# Altium schematic symbol library Analog Devices Operational Amplifiers.SchLib: 2102 symbols (part 23 of 35) (continued)
## ADA4004-1ARJZ-RL
designator U?
Single Channel Wide Bandwidth Operational Amplifier, 12 MHz BW, 2.7 V/us SR, Industrial, 5-pin SOT23 (RJ-5), Reel; Generic Part Number: ADA4004-1; Manufacturer: Analog Devices; PartNumber: ADA4004-1ARJZ-RL; Amplifiers Per Package: 1; Input Bias Current: 40nA; Input Offset Voltage: 40uV; Iq/Amp: 2.2mA; Small Signal Bandwidth: 12MHz; V Span Max: 30V; V Span Min: 10V; DatasheetVersion: Rev. G; PackageVersion: 121608-A; PackageReference: RJ-5; PackageDescription: 5-Pin Small Outline Transistor Package, Body 2.9 x 1.6 mm, Pitch 0.95 mm; Supplier 1: Digi-Key; Supplier Part Number 1: ADA4004-1ARJZ-RL-ND; Slew Rate: 2.7V/us; Mounting Technology: Surface Mount; Code_JEDEC: MO-178-AA; ComponentLink1Description: Manufacturer URL; ComponentLink1URL: http://www.analog.com/en/index.html; ComponentLink2Description: Datasheet; ComponentLink2URL: http://www.analog.com/static/imported-files/data_sheets/ADA4004-1_4004-2_4004-4.pdf; ComponentLink3Description: Package Specification; ComponentLink3URL: http://www.analog.com/static/imported-files/packages/PKG_PDF/SOT-23(RJ)/RJ_5.pdf
footprint ADI-RJ-5_N (SOT-23, 5-Leads, Body 2.9x1.6mm, Pitch 0.95mm, IPC Medium Density)
footprint ADI-RJ-5_L (SOT-23, 5-Leads, Body 2.9x1.6mm, Pitch 0.95mm, IPC High Density)
footprint ADI-RJ-5_M (SOT-23, 5-Leads, Body 2.9x1.6mm, Pitch 0.95mm, IPC Low Density)
pins: 1 OUT (out), 2 -V (power), 3 +IN (in), 4 -IN (in), 5 +V (power)

## ADA4004-1ARZ
designator U?
Single Channel Wide Bandwidth Operational Amplifier, 12 MHz BW, 2.7 V/us SR, Industrial, 8-pin SOIC (R-8), Tube; Generic Part Number: ADA4004-1; Manufacturer: Analog Devices; PartNumber: ADA4004-1ARZ; Amplifiers Per Package: 1; Input Bias Current: 40nA; Input Offset Voltage: 40uV; Iq/Amp: 2.2mA; Small Signal Bandwidth: 12MHz; V Span Max: 30V; V Span Min: 10V; DatasheetVersion: Rev. G; PackageVersion: 060506-A; PackageReference: R-8; PackageDescription: 8-Pin Standard Small Outline Package, Body 3.9 x 4.9 mm, Pitch 1.27 mm; Supplier 1: Digi-Key; Supplier Part Number 1: ADA4004-1ARZ-ND; Supplier 2: Farnell; Supplier Part Number 2: 2077698; Supplier 3: Newark; Supplier Part Number 3: 34P2947; Slew Rate: 2.7V/us; Mounting Technology: Surface Mount; Code_JEDEC: MS-012-AA; ComponentLink1Description: Manufacturer URL; ComponentLink1URL: http://www.analog.com/en/index.html; ComponentLink2Description: Datasheet; ComponentLink2URL: http://www.analog.com/static/imported-files/data_sheets/ADA4004-1_4004-2_4004-4.pdf; ComponentLink3Description: Package Specification; ComponentLink3URL: http://www.analog.com/static/imported-files/packages/PKG_PDF/SOIC_Narrow%20(R)/R_8.pdf
footprint ADI-R-8_N (SOIC, 8-Leads, Body 4.9x3.9mm, Pitch 1.27mm, IPC Medium Density)
footprint ADI-R-8_L (SOIC, 8-Leads, Body 4.9x3.9mm, Pitch 1.27mm, IPC High Density)
footprint ADI-R-8_M (SOIC, 8-Leads, Body 4.9x3.9mm, Pitch 1.27mm, IPC Low Density)
part A pins: 2 -IN (in), 3 +IN (in), 4 -V (power), 6 OUT (out), 7 +V (power)
part B pins: 1 NC, 5 NC, 8 NC

## ADA4004-1ARZ-R7
designator U?
Single Channel Wide Bandwidth Operational Amplifier, 12 MHz BW, 2.7 V/us SR, Industrial, 8-pin SOIC (R-8), Reel; Generic Part Number: ADA4004-1; Manufacturer: Analog Devices; PartNumber: ADA4004-1ARZ-R7; Amplifiers Per Package: 1; Input Bias Current: 40nA; Input Offset Voltage: 40uV; Iq/Amp: 2.2mA; Small Signal Bandwidth: 12MHz; V Span Max: 30V; V Span Min: 10V; DatasheetVersion: Rev. G; PackageVersion: 060506-A; PackageReference: R-8; PackageDescription: 8-Pin Standard Small Outline Package, Body 3.9 x 4.9 mm, Pitch 1.27 mm; Supplier 1: Digi-Key; Supplier Part Number 1: ADA4004-1ARZ-R7-ND; Slew Rate: 2.7V/us; Mounting Technology: Surface Mount; Code_JEDEC: MS-012-AA; ComponentLink1Description: Manufacturer URL; ComponentLink1URL: http://www.analog.com/en/index.html; ComponentLink2Description: Datasheet; ComponentLink2URL: http://www.analog.com/static/imported-files/data_sheets/ADA4004-1_4004-2_4004-4.pdf; ComponentLink3Description: Package Specification; ComponentLink3URL: http://www.analog.com/static/imported-files/packages/PKG_PDF/SOIC_Narrow%20(R)/R_8.pdf
footprint ADI-R-8_N (SOIC, 8-Leads, Body 4.9x3.9mm, Pitch 1.27mm, IPC Medium Density)
footprint ADI-R-8_L (SOIC, 8-Leads, Body 4.9x3.9mm, Pitch 1.27mm, IPC High Density)
footprint ADI-R-8_M (SOIC, 8-Leads, Body 4.9x3.9mm, Pitch 1.27mm, IPC Low Density)
part A pins: 2 -IN (in), 3 +IN (in), 4 -V (power), 6 OUT (out), 7 +V (power)
part B pins: 1 NC, 5 NC, 8 NC

## ADA4004-1ARZ-RL
designator U?
Single Channel Wide Bandwidth Operational Amplifier, 12 MHz BW, 2.7 V/us SR, Industrial, 8-pin SOIC (R-8), Reel; Generic Part Number: ADA4004-1; Manufacturer: Analog Devices; PartNumber: ADA4004-1ARZ-RL; Amplifiers Per Package: 1; Input Bias Current: 40nA; Input Offset Voltage: 40uV; Iq/Amp: 2.2mA; Small Signal Bandwidth: 12MHz; V Span Max: 30V; V Span Min: 10V; DatasheetVersion: Rev. G; PackageVersion: 060506-A; PackageReference: R-8; PackageDescription: 8-Pin Standard Small Outline Package, Body 3.9 x 4.9 mm, Pitch 1.27 mm; Supplier 1: Digi-Key; Supplier Part Number 1: ADA4004-1ARZ-RL-ND; Slew Rate: 2.7V/us; Mounting Technology: Surface Mount; Code_JEDEC: MS-012-AA; ComponentLink1Description: Manufacturer URL; ComponentLink1URL: http://www.analog.com/en/index.html; ComponentLink2Description: Datasheet; ComponentLink2URL: http://www.analog.com/static/imported-files/data_sheets/ADA4004-1_4004-2_4004-4.pdf; ComponentLink3Description: Package Specification; ComponentLink3URL: http://www.analog.com/static/imported-files/packages/PKG_PDF/SOIC_Narrow%20(R)/R_8.pdf
footprint ADI-R-8_N (SOIC, 8-Leads, Body 4.9x3.9mm, Pitch 1.27mm, IPC Medium Density)
footprint ADI-R-8_L (SOIC, 8-Leads, Body 4.9x3.9mm, Pitch 1.27mm, IPC High Density)
footprint ADI-R-8_M (SOIC, 8-Leads, Body 4.9x3.9mm, Pitch 1.27mm, IPC Low Density)
part A pins: 2 -IN (in), 3 +IN (in), 4 -V (power), 6 OUT (out), 7 +V (power)
part B pins: 1 NC, 5 NC, 8 NC

## ADA4004-2ARMZ
designator U?
Double Channel Wide Bandwidth Operational Amplifier, 12 MHz BW, 2.7 V/us SR, Industrial, 8-pin SOP (RM-8), Tube; Generic Part Number: ADA4004-2; Manufacturer: Analog Devices; PartNumber: ADA4004-2ARMZ; Amplifiers Per Package: 2; Input Bias Current: 40nA; Input Offset Voltage: 40uV; Iq/Amp: 2.2mA; Small Signal Bandwidth: 12MHz; V Span Max: 30V; V Span Min: 10V; DatasheetVersion: Rev. G; PackageReference: RM-8; PackageDescription: 8-Pin Mini Small Outline Package, Body 3 x 3 mm, Pitch 0.65 mm; Supplier 1: Digi-Key; Supplier Part Number 1: ADA4004-2ARMZ-ND; Supplier 2: Farnell; Supplier Part Number 2: 2077696; Supplier 3: Newark; Supplier Part Number 3: 34P2950; Slew Rate: 2.7V/us; Mounting Technology: Surface Mount; Code_JEDEC: MO-187-AA; ComponentLink1Description: Manufacturer URL; ComponentLink1URL: http://www.analog.com/en/index.html; ComponentLink2Description: Datasheet; ComponentLink2URL: http://www.analog.com/static/imported-files/data_sheets/ADA4004-1_4004-2_4004-4.pdf; ComponentLink3Description: Package Specification; ComponentLink3URL: http://www.analog.com/static/imported-files/packages/PKG_PDF/MSOP%28RM%29/RM_8.pdf; ComponentLink4Description: Reference Circuit; ComponentLink4URL: http://www.analog.com/en/all-operational-amplifiers-op-amps/operational-amplifiers-op-amps/ada4004-2/products/product.html#product-recommendations
footprint ADI-RM-8_N (SOP, 8-Leads, Body 3x3mm, Pitch 0.65mm, IPC Medium Density)
footprint ADI-RM-8_L (SOP, 8-Leads, Body 3x3mm, Pitch 0.65mm, IPC High Density)
footprint ADI-RM-8_M (SOP, 8-Leads, Body 3x3mm, Pitch 0.65mm, IPC Low Density)
pins on every part: 4 -V (power), 8 +V (power)
part A pins: 1 OUT A (out), 2 -IN A (in), 3 +IN A (in)
part B pins: 5 +IN B (in), 6 -IN B (in), 7 OUT B (out)

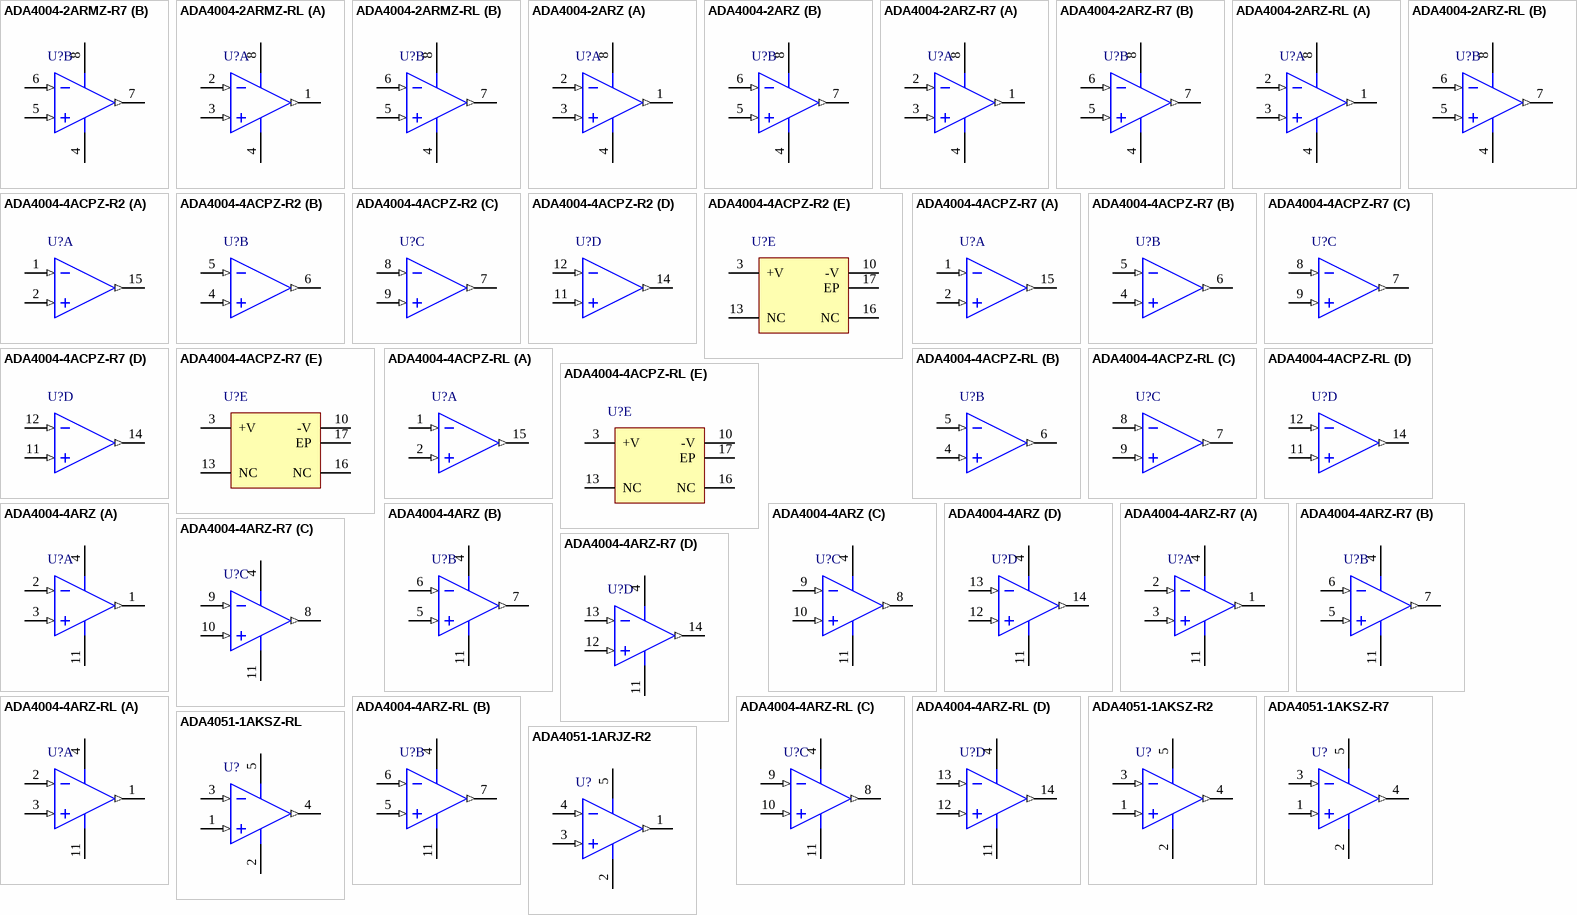
[diagram p73: symbols ADA4004-2ARMZ-R7 to ADA4051-1ARJZ-R2]

## ADA4004-2ARMZ-R7
designator U?
Double Channel Wide Bandwidth Operational Amplifier, 12 MHz BW, 2.7 V/us SR, Industrial, 8-pin SOP (RM-8), Reel; Generic Part Number: ADA4004-2; Manufacturer: Analog Devices; PartNumber: ADA4004-2ARMZ-R7; Amplifiers Per Package: 2; Input Bias Current: 40nA; Input Offset Voltage: 40uV; Iq/Amp: 2.2mA; Small Signal Bandwidth: 12MHz; V Span Max: 30V; V Span Min: 10V; DatasheetVersion: Rev. G; PackageReference: RM-8; PackageDescription: 8-Pin Mini Small Outline Package, Body 3 x 3 mm, Pitch 0.65 mm; Supplier 1: Digi-Key; Supplier Part Number 1: ADA4004-2ARMZ-R7TR-ND; Supplier 2: Digi-Key; Supplier Part Number 2: ADA4004-2ARMZ-R7CT-ND; Supplier 3: Digi-Key; Supplier Part Number 3: ADA4004-2ARMZ-R7DKR-ND; Supplier 4: Newark; Supplier Part Number 4: 34P2952; Slew Rate: 2.7V/us; Mounting Technology: Surface Mount; Code_JEDEC: MO-187-AA; ComponentLink1Description: Manufacturer URL; ComponentLink1URL: http://www.analog.com/en/index.html; ComponentLink2Description: Datasheet; ComponentLink2URL: http://www.analog.com/static/imported-files/data_sheets/ADA4004-1_4004-2_4004-4.pdf; ComponentLink3Description: Package Specification; ComponentLink3URL: http://www.analog.com/static/imported-files/packages/PKG_PDF/MSOP%28RM%29/RM_8.pdf; ComponentLink4Description: Reference Circuit; ComponentLink4URL: http://www.analog.com/en/all-operational-amplifiers-op-amps/operational-amplifiers-op-amps/ada4004-2/products/product.html#product-recommendations
footprint ADI-RM-8_N (SOP, 8-Leads, Body 3x3mm, Pitch 0.65mm, IPC Medium Density)
footprint ADI-RM-8_L (SOP, 8-Leads, Body 3x3mm, Pitch 0.65mm, IPC High Density)
footprint ADI-RM-8_M (SOP, 8-Leads, Body 3x3mm, Pitch 0.65mm, IPC Low Density)
pins on every part: 4 -V (power), 8 +V (power)
part A pins: 1 OUT A (out), 2 -IN A (in), 3 +IN A (in)
part B pins: 5 +IN B (in), 6 -IN B (in), 7 OUT B (out)

## ADA4004-2ARMZ-RL
designator U?
Double Channel Wide Bandwidth Operational Amplifier, 12 MHz BW, 2.7 V/us SR, Industrial, 8-pin SOP (RM-8), Reel; Generic Part Number: ADA4004-2; Manufacturer: Analog Devices; PartNumber: ADA4004-2ARMZ-RL; Amplifiers Per Package: 2; Input Bias Current: 40nA; Input Offset Voltage: 40uV; Iq/Amp: 2.2mA; Small Signal Bandwidth: 12MHz; V Span Max: 30V; V Span Min: 10V; DatasheetVersion: Rev. G; PackageReference: RM-8; PackageDescription: 8-Pin Mini Small Outline Package, Body 3 x 3 mm, Pitch 0.65 mm; Supplier 1: Digi-Key; Supplier Part Number 1: ADA4004-2ARMZ-RL-ND; Supplier 2: Newark; Supplier Part Number 2: 34P2951; Slew Rate: 2.7V/us; Mounting Technology: Surface Mount; Code_JEDEC: MO-187-AA; ComponentLink1Description: Manufacturer URL; ComponentLink1URL: http://www.analog.com/en/index.html; ComponentLink2Description: Datasheet; ComponentLink2URL: http://www.analog.com/static/imported-files/data_sheets/ADA4004-1_4004-2_4004-4.pdf; ComponentLink3Description: Package Specification; ComponentLink3URL: http://www.analog.com/static/imported-files/packages/PKG_PDF/MSOP%28RM%29/RM_8.pdf; ComponentLink4Description: Reference Circuit; ComponentLink4URL: http://www.analog.com/en/all-operational-amplifiers-op-amps/operational-amplifiers-op-amps/ada4004-2/products/product.html#product-recommendations
footprint ADI-RM-8_N (SOP, 8-Leads, Body 3x3mm, Pitch 0.65mm, IPC Medium Density)
footprint ADI-RM-8_L (SOP, 8-Leads, Body 3x3mm, Pitch 0.65mm, IPC High Density)
footprint ADI-RM-8_M (SOP, 8-Leads, Body 3x3mm, Pitch 0.65mm, IPC Low Density)
pins on every part: 4 -V (power), 8 +V (power)
part A pins: 1 OUT A (out), 2 -IN A (in), 3 +IN A (in)
part B pins: 5 +IN B (in), 6 -IN B (in), 7 OUT B (out)

## ADA4004-2ARZ
designator U?
Double Channel Wide Bandwidth Operational Amplifier, 12 MHz BW, 2.7 V/us SR, Industrial, 8-pin SOIC (R-8), Tube; Generic Part Number: ADA4004-2; Manufacturer: Analog Devices; PartNumber: ADA4004-2ARZ; Amplifiers Per Package: 2; Input Bias Current: 40nA; Input Offset Voltage: 40uV; Iq/Amp: 2.2mA; Small Signal Bandwidth: 12MHz; V Span Max: 30V; V Span Min: 10V; DatasheetVersion: Rev. G; PackageVersion: 060506-A; PackageReference: R-8; PackageDescription: 8-Pin Standard Small Outline Package, Body 3.9 x 4.9 mm, Pitch 1.27 mm; Supplier 1: Digi-Key; Supplier Part Number 1: ADA4004-2ARZ-ND; Supplier 2: Farnell; Supplier Part Number 2: 2077697; Supplier 3: Newark; Supplier Part Number 3: 34P2953; Slew Rate: 2.7V/us; Mounting Technology: Surface Mount; Code_JEDEC: MS-012-AA; ComponentLink1Description: Manufacturer URL; ComponentLink1URL: http://www.analog.com/en/index.html; ComponentLink2Description: Datasheet; ComponentLink2URL: http://www.analog.com/static/imported-files/data_sheets/ADA4004-1_4004-2_4004-4.pdf; ComponentLink3Description: Package Specification; ComponentLink3URL: http://www.analog.com/static/imported-files/packages/PKG_PDF/SOIC_Narrow%20(R)/R_8.pdf; ComponentLink4Description: Reference Circuit; ComponentLink4URL: http://www.analog.com/en/all-operational-amplifiers-op-amps/operational-amplifiers-op-amps/ada4004-2/products/product.html#product-recommendations
footprint ADI-R-8_N (SOIC, 8-Leads, Body 4.9x3.9mm, Pitch 1.27mm, IPC Medium Density)
footprint ADI-R-8_L (SOIC, 8-Leads, Body 4.9x3.9mm, Pitch 1.27mm, IPC High Density)
footprint ADI-R-8_M (SOIC, 8-Leads, Body 4.9x3.9mm, Pitch 1.27mm, IPC Low Density)
pins on every part: 4 -V (power), 8 +V (power)
part A pins: 1 OUT A (out), 2 -IN A (in), 3 +IN A (in)
part B pins: 5 +IN B (in), 6 -IN B (in), 7 OUT B (out)

## ADA4004-2ARZ-R7
designator U?
Double Channel Wide Bandwidth Operational Amplifier, 12 MHz BW, 2.7 V/us SR, Industrial, 8-pin SOIC (R-8), Reel; Generic Part Number: ADA4004-2; Manufacturer: Analog Devices; PartNumber: ADA4004-2ARZ-R7; Amplifiers Per Package: 2; Input Bias Current: 40nA; Input Offset Voltage: 40uV; Iq/Amp: 2.2mA; Small Signal Bandwidth: 12MHz; V Span Max: 30V; V Span Min: 10V; DatasheetVersion: Rev. G; PackageVersion: 060506-A; PackageReference: R-8; PackageDescription: 8-Pin Standard Small Outline Package, Body 3.9 x 4.9 mm, Pitch 1.27 mm; Supplier 1: Digi-Key; Supplier Part Number 1: ADA4004-2ARZ-R7TR-ND; Supplier 2: Digi-Key; Supplier Part Number 2: ADA4004-2ARZ-R7CT-ND; Supplier 3: Digi-Key; Supplier Part Number 3: ADA4004-2ARZ-R7DKR-ND; Slew Rate: 2.7V/us; Mounting Technology: Surface Mount; Code_JEDEC: MS-012-AA; ComponentLink1Description: Manufacturer URL; ComponentLink1URL: http://www.analog.com/en/index.html; ComponentLink2Description: Datasheet; ComponentLink2URL: http://www.analog.com/static/imported-files/data_sheets/ADA4004-1_4004-2_4004-4.pdf; ComponentLink3Description: Package Specification; ComponentLink3URL: http://www.analog.com/static/imported-files/packages/PKG_PDF/SOIC_Narrow%20(R)/R_8.pdf; ComponentLink4Description: Reference Circuit; ComponentLink4URL: http://www.analog.com/en/all-operational-amplifiers-op-amps/operational-amplifiers-op-amps/ada4004-2/products/product.html#product-recommendations
footprint ADI-R-8_N (SOIC, 8-Leads, Body 4.9x3.9mm, Pitch 1.27mm, IPC Medium Density)
footprint ADI-R-8_L (SOIC, 8-Leads, Body 4.9x3.9mm, Pitch 1.27mm, IPC High Density)
footprint ADI-R-8_M (SOIC, 8-Leads, Body 4.9x3.9mm, Pitch 1.27mm, IPC Low Density)
pins on every part: 4 -V (power), 8 +V (power)
part A pins: 1 OUT A (out), 2 -IN A (in), 3 +IN A (in)
part B pins: 5 +IN B (in), 6 -IN B (in), 7 OUT B (out)

## ADA4004-2ARZ-RL
designator U?
Double Channel Wide Bandwidth Operational Amplifier, 12 MHz BW, 2.7 V/us SR, Industrial, 8-pin SOIC (R-8), Reel; Generic Part Number: ADA4004-2; Manufacturer: Analog Devices; PartNumber: ADA4004-2ARZ-RL; Amplifiers Per Package: 2; Input Bias Current: 40nA; Input Offset Voltage: 40uV; Iq/Amp: 2.2mA; Small Signal Bandwidth: 12MHz; V Span Max: 30V; V Span Min: 10V; DatasheetVersion: Rev. G; PackageVersion: 060506-A; PackageReference: R-8; PackageDescription: 8-Pin Standard Small Outline Package, Body 3.9 x 4.9 mm, Pitch 1.27 mm; Supplier 1: Digi-Key; Supplier Part Number 1: ADA4004-2ARZ-RL-ND; Slew Rate: 2.7V/us; Mounting Technology: Surface Mount; Code_JEDEC: MS-012-AA; ComponentLink1Description: Manufacturer URL; ComponentLink1URL: http://www.analog.com/en/index.html; ComponentLink2Description: Datasheet; ComponentLink2URL: http://www.analog.com/static/imported-files/data_sheets/ADA4004-1_4004-2_4004-4.pdf; ComponentLink3Description: Package Specification; ComponentLink3URL: http://www.analog.com/static/imported-files/packages/PKG_PDF/SOIC_Narrow%20(R)/R_8.pdf; ComponentLink4Description: Reference Circuit; ComponentLink4URL: http://www.analog.com/en/all-operational-amplifiers-op-amps/operational-amplifiers-op-amps/ada4004-2/products/product.html#product-recommendations
footprint ADI-R-8_N (SOIC, 8-Leads, Body 4.9x3.9mm, Pitch 1.27mm, IPC Medium Density)
footprint ADI-R-8_L (SOIC, 8-Leads, Body 4.9x3.9mm, Pitch 1.27mm, IPC High Density)
footprint ADI-R-8_M (SOIC, 8-Leads, Body 4.9x3.9mm, Pitch 1.27mm, IPC Low Density)
pins on every part: 4 -V (power), 8 +V (power)
part A pins: 1 OUT A (out), 2 -IN A (in), 3 +IN A (in)
part B pins: 5 +IN B (in), 6 -IN B (in), 7 OUT B (out)

## ADA4004-4ACPZ-R2
designator U?
Quad Channel Wide Bandwidth Operational Amplifier, 12 MHz BW, 2.7 V/us SR, Industrial, 16-pin QFN (CP-16-4), Reel; Generic Part Number: ADA4004-4; Manufacturer: Analog Devices; PartNumber: ADA4004-4ACPZ-R2; Amplifiers Per Package: 4; Input Bias Current: 40nA; Input Offset Voltage: 40uV; Iq/Amp: 2.2mA; Small Signal Bandwidth: 12MHz; V Span Max: 30V; V Span Min: 10V; DatasheetVersion: Rev. G; PackageVersion: 010606-0; PackageReference: CP-16-4; PackageDescription: 16-Pin Lead Frame Chip Scale Package, Body 4 x 4 mm, Pitch 0.65 mm; Supplier 1: Digi-Key; Supplier Part Number 1: ADA4004-4ACPZ-R2-ND; Supplier 2: Newark; Supplier Part Number 2: 28M3501; Slew Rate: 2.7V/us; Mounting Technology: Surface Mount; Code_JEDEC: MO-220-VGGC; ComponentLink1Description: Manufacturer URL; ComponentLink1URL: http://www.analog.com/en/index.html; ComponentLink2Description: Datasheet; ComponentLink2URL: http://www.analog.com/static/imported-files/data_sheets/ADA4004-1_4004-2_4004-4.pdf; ComponentLink3Description: Package Specification; ComponentLink3URL: http://www.analog.com/static/imported-files/packages/46009454504174339653421710019CP_16_4.pdf
footprint CP-16-4_N (QFN, 16-Leads, Body 4x4mm, Pitch 0.65mm, Thermal Pad 2.1x2.1mm, IPC Medium Density)
footprint CP-16-4_L (QFN, 16-Leads, Body 4x4mm, Pitch 0.65mm, Thermal Pad 2.1x2.1mm, IPC High Density)
footprint CP-16-4_M (QFN, 16-Leads, Body 4x4mm, Pitch 0.65mm, Thermal Pad 2.1x2.1mm, IPC Low Density)
part A pins: 1 -IN A (in), 2 +IN A (in), 15 OUT A (out)
part B pins: 4 +IN B (in), 5 -IN B (in), 6 OUT B (out)
part C pins: 7 OUT C (out), 8 -IN C (in), 9 +IN C (in)
part D pins: 11 +IN D (in), 12 -IN D (in), 14 OUT D (out)
part E pins: 3 +V (power), 10 -V (power), 13 NC, 16 NC, 17 EP (power) "IT IS RECOMMENDED THAT THE EXPOSED PAD BE CONNECTED TO V-."

## ADA4004-4ACPZ-R7
designator U?
Quad Channel Wide Bandwidth Operational Amplifier, 12 MHz BW, 2.7 V/us SR, Industrial, 16-pin QFN (CP-16-4), Reel; Generic Part Number: ADA4004-4; Manufacturer: Analog Devices; PartNumber: ADA4004-4ACPZ-R7; Amplifiers Per Package: 4; Input Bias Current: 40nA; Input Offset Voltage: 40uV; Iq/Amp: 2.2mA; Small Signal Bandwidth: 12MHz; V Span Max: 30V; V Span Min: 10V; DatasheetVersion: Rev. G; PackageVersion: 010606-0; PackageReference: CP-16-4; PackageDescription: 16-Pin Lead Frame Chip Scale Package, Body 4 x 4 mm, Pitch 0.65 mm; Supplier 1: Digi-Key; Supplier Part Number 1: ADA4004-4ACPZ-R7TR-ND; Supplier 2: Digi-Key; Supplier Part Number 2: ADA4004-4ACPZ-R7CT-ND; Supplier 3: Digi-Key; Supplier Part Number 3: ADA4004-4ACPZ-R7DKR-ND; Supplier 4: Newark; Supplier Part Number 4: 28M3502; Slew Rate: 2.7V/us; Mounting Technology: Surface Mount; Code_JEDEC: MO-220-VGGC; ComponentLink1Description: Manufacturer URL; ComponentLink1URL: http://www.analog.com/en/index.html; ComponentLink2Description: Datasheet; ComponentLink2URL: http://www.analog.com/static/imported-files/data_sheets/ADA4004-1_4004-2_4004-4.pdf; ComponentLink3Description: Package Specification; ComponentLink3URL: http://www.analog.com/static/imported-files/packages/46009454504174339653421710019CP_16_4.pdf
footprint CP-16-4_N (QFN, 16-Leads, Body 4x4mm, Pitch 0.65mm, Thermal Pad 2.1x2.1mm, IPC Medium Density)
footprint CP-16-4_L (QFN, 16-Leads, Body 4x4mm, Pitch 0.65mm, Thermal Pad 2.1x2.1mm, IPC High Density)
footprint CP-16-4_M (QFN, 16-Leads, Body 4x4mm, Pitch 0.65mm, Thermal Pad 2.1x2.1mm, IPC Low Density)
part A pins: 1 -IN A (in), 2 +IN A (in), 15 OUT A (out)
part B pins: 4 +IN B (in), 5 -IN B (in), 6 OUT B (out)
part C pins: 7 OUT C (out), 8 -IN C (in), 9 +IN C (in)
part D pins: 11 +IN D (in), 12 -IN D (in), 14 OUT D (out)
part E pins: 3 +V (power), 10 -V (power), 13 NC, 16 NC, 17 EP (power) "IT IS RECOMMENDED THAT THE EXPOSED PAD BE CONNECTED TO V-."

## ADA4004-4ACPZ-RL
designator U?
Quad Channel Wide Bandwidth Operational Amplifier, 12 MHz BW, 2.7 V/us SR, Industrial, 16-pin QFN (CP-16-4), Reel; Generic Part Number: ADA4004-4; Manufacturer: Analog Devices; PartNumber: ADA4004-4ACPZ-RL; Amplifiers Per Package: 4; Input Bias Current: 40nA; Input Offset Voltage: 40uV; Iq/Amp: 2.2mA; Small Signal Bandwidth: 12MHz; V Span Max: 30V; V Span Min: 10V; DatasheetVersion: Rev. G; PackageVersion: 010606-0; PackageReference: CP-16-4; PackageDescription: 16-Pin Lead Frame Chip Scale Package, Body 4 x 4 mm, Pitch 0.65 mm; Supplier 1: Digi-Key; Supplier Part Number 1: ADA4004-4ACPZ-RL-ND; Supplier 2: Newark; Supplier Part Number 2: 28M3500; Slew Rate: 2.7V/us; Mounting Technology: Surface Mount; Code_JEDEC: MO-220-VGGC; ComponentLink1Description: Manufacturer URL; ComponentLink1URL: http://www.analog.com/en/index.html; ComponentLink2Description: Datasheet; ComponentLink2URL: http://www.analog.com/static/imported-files/data_sheets/ADA4004-1_4004-2_4004-4.pdf; ComponentLink3Description: Package Specification; ComponentLink3URL: http://www.analog.com/static/imported-files/packages/46009454504174339653421710019CP_16_4.pdf
footprint CP-16-4_N (QFN, 16-Leads, Body 4x4mm, Pitch 0.65mm, Thermal Pad 2.1x2.1mm, IPC Medium Density)
footprint CP-16-4_L (QFN, 16-Leads, Body 4x4mm, Pitch 0.65mm, Thermal Pad 2.1x2.1mm, IPC High Density)
footprint CP-16-4_M (QFN, 16-Leads, Body 4x4mm, Pitch 0.65mm, Thermal Pad 2.1x2.1mm, IPC Low Density)
part A pins: 1 -IN A (in), 2 +IN A (in), 15 OUT A (out)
part B pins: 4 +IN B (in), 5 -IN B (in), 6 OUT B (out)
part C pins: 7 OUT C (out), 8 -IN C (in), 9 +IN C (in)
part D pins: 11 +IN D (in), 12 -IN D (in), 14 OUT D (out)
part E pins: 3 +V (power), 10 -V (power), 13 NC, 16 NC, 17 EP (power) "IT IS RECOMMENDED THAT THE EXPOSED PAD BE CONNECTED TO V-."

## ADA4004-4ARZ
designator U?
Quad Channel Wide Bandwidth Operational Amplifier, 12 MHz BW, 2.7 V/us SR, Industrial, 14-pin SOIC (R-14), Tube; Generic Part Number: ADA4004-4; Manufacturer: Analog Devices; PartNumber: ADA4004-4ARZ; Amplifiers Per Package: 4; Input Bias Current: 40nA; Input Offset Voltage: 40uV; Iq/Amp: 2.2mA; Small Signal Bandwidth: 12MHz; V Span Max: 30V; V Span Min: 10V; DatasheetVersion: Rev. G; PackageVersion: 060606-A; PackageReference: R-14; PackageDescription: 14-Pin Standard Small Outline Package, Body 8.65 x 3.9 mm, Pitch 1.27 mm; Supplier 1: Digi-Key; Supplier Part Number 1: ADA4004-4ARZ-ND; Supplier 2: Newark; Supplier Part Number 2: 28M3503; Slew Rate: 2.7V/us; Mounting Technology: Surface Mount; Code_JEDEC: MS-012-AB; ComponentLink1Description: Manufacturer URL; ComponentLink1URL: http://www.analog.com/en/index.html; ComponentLink2Description: Datasheet; ComponentLink2URL: http://www.analog.com/static/imported-files/data_sheets/ADA4004-1_4004-2_4004-4.pdf; ComponentLink3Description: Package Specification; ComponentLink3URL: http://www.analog.com/static/imported-files/packages/PKG_PDF/SOIC_Narrow%20(R)/R_14.pdf
footprint ADI-R-14_N (SOIC, 14-Leads, Body 8.65x3.9mm, Pitch 1.27mm, IPC Medium Density)
footprint ADI-R-14_L (SOIC, 14-Leads, Body 8.65x3.9mm, Pitch 1.27mm, IPC High Density)
footprint ADI-R-14_M (SOIC, 14-Leads, Body 8.65x3.9mm, Pitch 1.27mm, IPC Low Density)
pins on every part: 4 +V (power), 11 -V (power)
part A pins: 1 OUT A (out), 2 -IN A (in), 3 +IN A (in)
part B pins: 5 +IN B (in), 6 -IN B (in), 7 OUT B (out)
part C pins: 8 OUT C (out), 9 -IN C (in), 10 +IN C (in)
part D pins: 12 +IN D (in), 13 -IN D (in), 14 OUT D (out)

## ADA4004-4ARZ-R7
designator U?
Quad Channel Wide Bandwidth Operational Amplifier, 12 MHz BW, 2.7 V/us SR, Industrial, 14-pin SOIC (R-14), Reel; Generic Part Number: ADA4004-4; Manufacturer: Analog Devices; PartNumber: ADA4004-4ARZ-R7; Amplifiers Per Package: 4; Input Bias Current: 40nA; Input Offset Voltage: 40uV; Iq/Amp: 2.2mA; Small Signal Bandwidth: 12MHz; V Span Max: 30V; V Span Min: 10V; DatasheetVersion: Rev. G; PackageVersion: 060606-A; PackageReference: R-14; PackageDescription: 14-Pin Standard Small Outline Package, Body 8.65 x 3.9 mm, Pitch 1.27 mm; Supplier 1: Digi-Key; Supplier Part Number 1: ADA4004-4ARZ-R7TR-ND; Supplier 2: Digi-Key; Supplier Part Number 2: ADA4004-4ARZ-R7CT-ND; Supplier 3: Digi-Key; Supplier Part Number 3: ADA4004-4ARZ-R7DKR-ND; Slew Rate: 2.7V/us; Mounting Technology: Surface Mount; Code_JEDEC: MS-012-AB; ComponentLink1Description: Manufacturer URL; ComponentLink1URL: http://www.analog.com/en/index.html; ComponentLink2Description: Datasheet; ComponentLink2URL: http://www.analog.com/static/imported-files/data_sheets/ADA4004-1_4004-2_4004-4.pdf; ComponentLink3Description: Package Specification; ComponentLink3URL: http://www.analog.com/static/imported-files/packages/PKG_PDF/SOIC_Narrow%20(R)/R_14.pdf
footprint ADI-R-14_N (SOIC, 14-Leads, Body 8.65x3.9mm, Pitch 1.27mm, IPC Medium Density)
footprint ADI-R-14_L (SOIC, 14-Leads, Body 8.65x3.9mm, Pitch 1.27mm, IPC High Density)
footprint ADI-R-14_M (SOIC, 14-Leads, Body 8.65x3.9mm, Pitch 1.27mm, IPC Low Density)
pins on every part: 4 +V (power), 11 -V (power)
part A pins: 1 OUT A (out), 2 -IN A (in), 3 +IN A (in)
part B pins: 5 +IN B (in), 6 -IN B (in), 7 OUT B (out)
part C pins: 8 OUT C (out), 9 -IN C (in), 10 +IN C (in)
part D pins: 12 +IN D (in), 13 -IN D (in), 14 OUT D (out)